# Altium footprint library Relays.PcbLib: 115 footprints (part 6 of 8)
Each footprint in its own frame and in the unit in brackets; x right, y up, seen from the top. Pads: shape width x height; smd on the part's side, far side on the other; paste and mask are expansions set on the pad; w line width, h text height; cw(c..) or ccw(c..) is an arc to the next point about the centre after c.
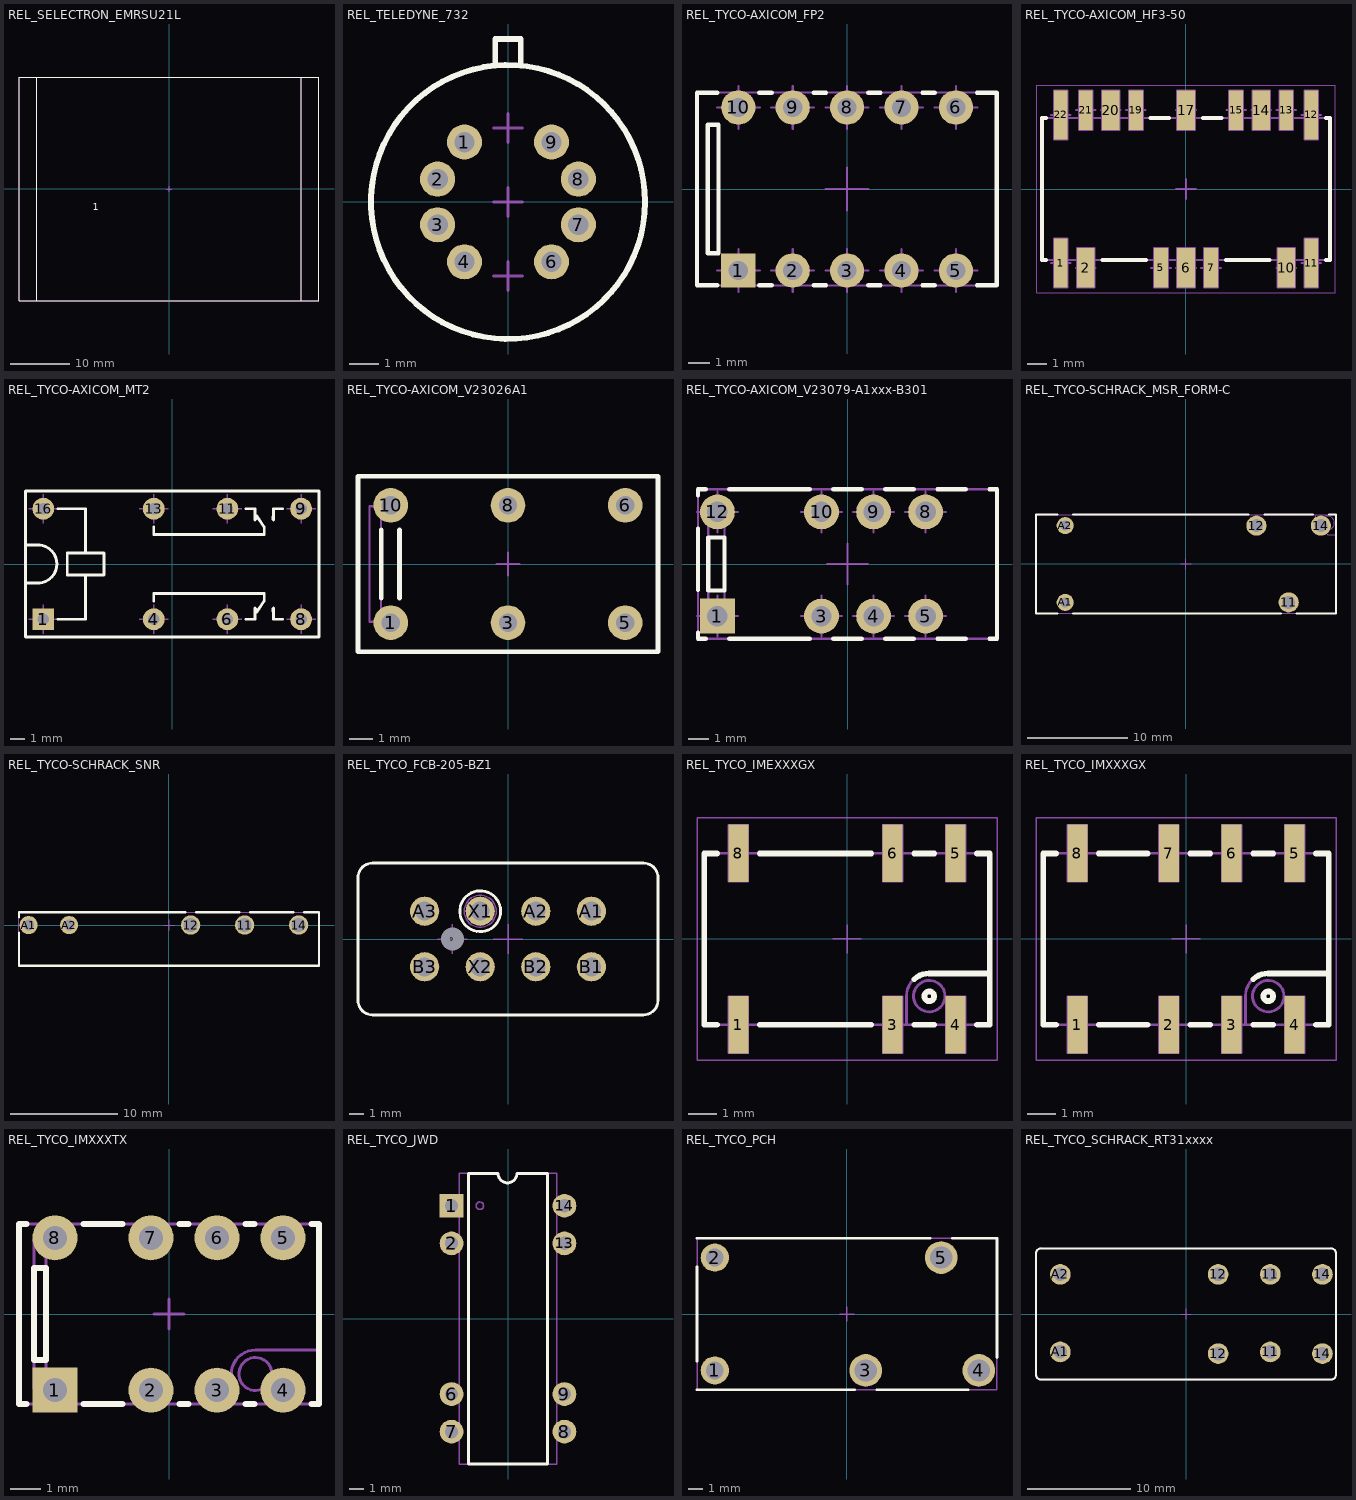
[diagram p5: the footprints below, top view; thin cyan lines are the x and y axes]

## REL_SELECTRON_EMRSU21L [mm] "Round Pluggable 11 Contacts, Body 51mm x 38mm, SELECTRON EMR Series"
height 80
Top Overlay:
  lines w0.2: -22.5,-19 -22.5,19 ; 22.5,-19 22.5,19 ; -25.5,-19 -25.5,19 25.5,19 25.5,-19 -25.5,-19
  text "1" at -12.985,-3.645 h1.2
Mechanical 8:
  lines w0.1: -0.5,0 0,0 ; 0,-0.5 0,0 ; 0,0.5 0,0 ; 0.5,0 0,0
Mechanical 14:
  lines w0.1: -22.5,-19 -22.5,19 ; 22.5,-19 22.5,19 ; -25.5,-19 -25.5,19 25.5,19 25.5,-19 -25.5,-19
  text "1" at -12.985,-3.645 h1.2
3D body "REL_SELECTRON_EMRSU21L.stp": height 67, standoff -13, extent -25.5,-19 25.5,19

## REL_TELEDYNE_732 [mm] "TELEDYNE Case TO-5, 8 Leads, Body Diameter 9.4m, x Height 9.76mm, 732 Series"
height 9.76
pads (8):
  round 1.2 hole 0.7: 1(-1.493,2.055) 2(-2.416,0.785) 3(-2.416,-0.785) 4(-1.493,-2.055) 6(1.493,-2.055) 7(2.416,-0.785) 8(2.416,0.785) 9(1.493,2.055)
Top Overlay:
  circle w0.2: c0,0 r4.7
  lines w0.2: -0.435,4.68 -0.435,5.59 0.435,5.59 0.435,4.68
Mechanical 8:
  lines w0.1: -2.891,-0.939 -2.416,-0.785 ; -2.891,0.939 -2.416,0.785 ; -2.57,-0.309 -2.416,-0.785 ; -2.57,0.309 -2.416,0.785 ; -2.261,-1.26 -2.416,-0.785 ; -2.261,1.26 -2.416,0.785 ; -1.94,-0.63 -2.416,-0.785 ; -1.94,0.63 -2.416,0.785 ; -1.897,-1.761 -1.493,-2.055 ; -1.897,1.761 -1.493,2.055 ; -1.787,-2.459 -1.493,-2.055 ; -1.787,2.459 -1.493,2.055 ; -1.199,-1.65 -1.493,-2.055 ; -1.199,1.65 -1.493,2.055 ; -1.088,-2.349 -1.493,-2.055 ; -1.088,2.349 -1.493,2.055 ; -0.5,0 0,0 ; -0.5,2.54 0,2.54 ; 0,-0.5 0,0 ; 0,0.5 0,0 ; 0,2.04 0,2.54 ; 0,3.04 0,2.54 ; 0.5,0 0,0 ; 0.5,2.54 0,2.54 ; 1.088,-2.349 1.493,-2.055 ; 1.088,2.349 1.493,2.055 ; 1.199,-1.65 1.493,-2.055 ; 1.199,1.65 1.493,2.055 ; 1.787,-2.459 1.493,-2.055 ; 1.787,2.459 1.493,2.055 ; 1.897,-1.761 1.493,-2.055 ; 1.897,1.761 1.493,2.055 ; 1.94,-0.63 2.416,-0.785 ; 1.94,0.63 2.416,0.785 ; 2.261,-1.26 2.416,-0.785 ; 2.261,1.26 2.416,0.785 ; 2.57,-0.309 2.416,-0.785 ; 2.57,0.309 2.416,0.785 ; 2.891,-0.939 2.416,-0.785 ; 2.891,0.939 2.416,0.785 ; 0,-2.54 -0.5,-2.54 0,-2.54 ; 0,-2.54 0,-2.04 0,-2.54 ; 0,-2.54 0.5,-2.54 0,-2.54 ; 0,-2.54 0,-3.04 0,-2.54
Mechanical 14:
  circle w0.1: c0,0 r4.7
  lines w0.1: -0.435,4.68 -0.435,5.59 0.435,5.59 0.435,4.68
3D body "REL_TELEDYNE_732.stp": height 9.76, standoff -3.8, extent -4.7,-4.693 4.7,5.59

## REL_TYCO-AXICOM_FP2 [mm] "Relay, 10 Leads, Row Spacing 7.62 mm; Body 14mm x 9mm, AXICOM FP2 Series"
height 5.1
pads (10):
  rect 1.6x1.6 hole 0.9: 1(-5.08,-3.81)
  round 1.6 hole 0.9: 2(-2.54,-3.81) 3(0,-3.81) 4(2.54,-3.81) 5(5.08,-3.81) 6(5.08,3.81) 7(2.54,3.81) 8(0,3.81) 9(-2.54,3.81) 10(-5.08,3.81)
Top Overlay:
  lines w0.2: -6.062,-4.5 -7.01,-4.5 -7.01,4.5 -6.062,4.5 ; -4.098,-4.5 -3.522,-4.5 ; -4.098,4.5 -3.522,4.5 ; -1.558,-4.5 -0.982,-4.5 ; -1.558,4.5 -0.982,4.5 ; 0.982,-4.5 1.558,-4.5 ; 0.982,4.5 1.558,4.5 ; 3.522,-4.5 4.098,-4.5 ; 3.522,4.5 4.098,4.5 ; 6.062,-4.5 6.99,-4.5 6.99,4.5 6.062,4.5 ; -6.51,-3 -6.01,-3 -6.01,3 -6.51,3 -6.51,-3
Mechanical 8:
  lines w0.1: -6.08,-3.81 -5.08,-3.81 ; -6.08,3.81 -5.08,3.81 ; -5.08,-4.81 -5.08,-3.81 ; -5.08,-2.81 -5.08,-3.81 ; -5.08,2.81 -5.08,3.81 ; -5.08,4.81 -5.08,3.81 ; -4.08,-3.81 -5.08,-3.81 ; -4.08,3.81 -5.08,3.81 ; -3.54,-3.81 -2.54,-3.81 ; -3.54,3.81 -2.54,3.81 ; -2.54,-4.81 -2.54,-3.81 ; -2.54,-2.81 -2.54,-3.81 ; -2.54,2.81 -2.54,3.81 ; -2.54,4.81 -2.54,3.81 ; -1.54,-3.81 -2.54,-3.81 ; -1.54,3.81 -2.54,3.81 ; -1,-3.81 0,-3.81 ; -1,0 0,0 ; -1,3.81 0,3.81 ; 0,-4.81 0,-3.81 ; 0,-2.81 0,-3.81 ; 0,-1 0,0 ; 0,1 0,0 ; 0,2.81 0,3.81 ; 0,4.81 0,3.81 ; 1,-3.81 0,-3.81 ; 1,0 0,0 ; 1,3.81 0,3.81 ; 1.54,-3.81 2.54,-3.81 ; 1.54,3.81 2.54,3.81 ; 2.54,-4.81 2.54,-3.81 ; 2.54,-2.81 2.54,-3.81 ; 2.54,2.81 2.54,3.81 ; 2.54,4.81 2.54,3.81 ; 3.54,-3.81 2.54,-3.81 ; 3.54,3.81 2.54,3.81 ; 4.08,-3.81 5.08,-3.81 ; 4.08,3.81 5.08,3.81 ; 5.08,-4.81 5.08,-3.81 ; 5.08,-2.81 5.08,-3.81 ; 5.08,2.81 5.08,3.81 ; 5.08,4.81 5.08,3.81 ; 6.08,-3.81 5.08,-3.81 ; 6.08,3.81 5.08,3.81
Mechanical 14:
  lines w0.1: -7,-4.5 7,-4.5 7,4.5 -7,4.5 -7,-4.5 ; -6.51,-3 -6.01,-3 -6.01,3 -6.51,3 -6.51,-3
3D body "REL_TYCO-AXICOM_FP2.stp": height 5.2, standoff -3.5, extent -7.01,-4.5 6.99,4.5

## REL_TYCO-AXICOM_HF3-50 [mm] "SMT Relay, HF3 Series, 50 Ohm Version, Body 14.6mm x 7.2mm"
height 10.5
pads (16):
  rect 0.7x2.5 smd: 1(-6.35,-3.75) 11(6.35,-3.75) 12(6.35,3.75) 22(-6.35,3.75)
  rect 0.9x2 smd: 2(-5.08,-4) 6(0,-4) 10(5.08,-4) 14(3.81,4) 17(0,4) 20(-3.81,4)
  rect 0.7x2 smd: 5(-1.27,-4) 7(1.27,-4) 13(5.08,4) 15(2.54,4) 19(-2.54,4) 21(-5.08,4)
Top Overlay:
  lines w0.2: -7.1,-3.6 -7.3,-3.6 -7.3,3.6 -7.1,3.6 ; -4.23,-3.6 -2.02,-3.6 ; -1.79,3.6 -0.85,3.6 ; 0.85,3.6 1.79,3.6 ; 2.02,-3.6 4.23,-3.6 ; 7.1,-3.6 7.3,-3.6 7.3,3.6 7.1,3.6
Mechanical 8:
  lines w0.1: -6.85,-3.75 -6.35,-3.75 ; -6.85,3.75 -6.35,3.75 ; -6.35,-4.25 -6.35,-3.75 ; -6.35,-3.25 -6.35,-3.75 ; -6.35,3.25 -6.35,3.75 ; -6.35,4.25 -6.35,3.75 ; -5.85,-3.75 -6.35,-3.75 ; -5.85,3.75 -6.35,3.75 ; -5.58,-4 -5.08,-4 ; -5.58,4 -5.08,4 ; -5.08,-4.5 -5.08,-4 ; -5.08,-3.5 -5.08,-4 ; -5.08,3.5 -5.08,4 ; -5.08,4.5 -5.08,4 ; -4.58,-4 -5.08,-4 ; -4.58,4 -5.08,4 ; -4.31,4 -3.81,4 ; -3.81,3.5 -3.81,4 ; -3.81,4.5 -3.81,4 ; -3.31,4 -3.81,4 ; -3.04,4 -2.54,4 ; -2.54,3.5 -2.54,4 ; -2.54,4.5 -2.54,4 ; -2.04,4 -2.54,4 ; -1.77,-4 -1.27,-4 ; -1.27,-4.5 -1.27,-4 ; -1.27,-3.5 -1.27,-4 ; -0.77,-4 -1.27,-4 ; -0.5,-4 0,-4 ; -0.5,0 0,0 ; -0.5,4 0,4 ; 0,-4.5 0,-4 ; 0,-3.5 0,-4 ; 0,-0.5 0,0 ; 0,0.5 0,0 ; 0,3.5 0,4 ; 0,4.5 0,4 ; 0.5,-4 0,-4 ; 0.5,0 0,0 ; 0.5,4 0,4 ; 0.77,-4 1.27,-4 ; 1.27,-4.5 1.27,-4 ; 1.27,-3.5 1.27,-4 ; 1.77,-4 1.27,-4 ; 2.04,4 2.54,4 ; 2.54,3.5 2.54,4 ; 2.54,4.5 2.54,4 ; 3.04,4 2.54,4 ; 3.31,4 3.81,4 ; 3.81,3.5 3.81,4 ; 3.81,4.5 3.81,4 ; 4.31,4 3.81,4 ; 4.58,-4 5.08,-4 ; 4.58,4 5.08,4 ; 5.08,-4.5 5.08,-4 ; 5.08,-3.5 5.08,-4 ; 5.08,3.5 5.08,4 ; 5.08,4.5 5.08,4 ; 5.58,-4 5.08,-4 ; 5.58,4 5.08,4 ; 5.85,-3.75 6.35,-3.75 ; 5.85,3.75 6.35,3.75 ; 6.35,-4.25 6.35,-3.75 ; 6.35,-3.25 6.35,-3.75 ; 6.35,3.25 6.35,3.75 ; 6.35,4.25 6.35,3.75 ; 6.85,-3.75 6.35,-3.75 ; 6.85,3.75 6.35,3.75 ; -6.7,-5 -6.7,-2.5 -6,-2.5 -6,-5 -6.7,-5 ; -6.7,2.5 -6.7,5 -6,5 -6,2.5 -6.7,2.5 ; -5.53,-5 -5.53,-3 -4.63,-3 -4.63,-5 -5.53,-5 ; -5.43,3 -4.73,3 -4.73,5 -5.43,5 -5.43,3 ; -4.26,3 -3.36,3 -3.36,5 -4.26,5 -4.26,3 ; -2.89,3 -2.19,3 -2.19,5 -2.89,5 -2.89,3 ; -1.62,-5 -0.92,-5 -0.92,-3 -1.62,-3 -1.62,-5 ; -0.45,-5 0.45,-5 0.45,-3 -0.45,-3 -0.45,-5 ; -0.45,3 0.45,3 0.45,5 -0.45,5 -0.45,3 ; 0.92,-5 1.62,-5 1.62,-3 0.92,-3 0.92,-5 ; 2.19,3 2.89,3 2.89,5 2.19,5 2.19,3 ; 3.36,3 4.26,3 4.26,5 3.36,5 3.36,3 ; 4.63,-5 5.53,-5 5.53,-3 4.63,-3 4.63,-5 ; 4.73,3 5.43,3 5.43,5 4.73,5 4.73,3 ; 6,-5 6,-2.5 6.7,-2.5 6.7,-5 6,-5 ; 6,2.5 6,5 6.7,5 6.7,2.5 6,2.5
Mechanical 14:
  lines w0.1: -7.3,-3.6 -7.3,3.6 7.3,3.6 7.3,-3.6 -7.3,-3.6
Mechanical 15:
  lines w0.05: -7.55,-5.25 7.55,-5.25 7.55,5.25 -7.55,5.25 -7.55,-5.25
3D body "REL_TYCO-AXICOM_HF3-50.stp": height 10, standoff 0, extent -7.3,-4.7 7.3,4.7

## REL_TYCO-AXICOM_MT2 [mm] "8 Leads, Row Spacing 7.62 mm; Body 20.25mm x 10.05mm, AXICOM MT2 Series"
height 11.2
pads (8):
  rect 1.5x1.5 hole 0.8: 1(-8.89,-3.81)
  round 1.5 hole 0.8: 4(-1.27,-3.81) 6(3.81,-3.81) 8(8.89,-3.81) 9(8.89,3.81) 11(3.81,3.81) 13(-1.27,3.81) 16(-8.89,3.81)
Top Overlay:
  lines w0.2: -10.125,-1.3 -9.125,-1.3 ccw(c-9.257,0) -9.125,1.3 -10.125,1.3 ; -7.874,-3.81 -5.969,-3.81 -5.969,-0.762 ; -7.874,3.81 -5.969,3.81 -5.969,0.762 ; -1.27,-2.54 -1.27,-2.032 6.35,-2.032 6.35,-2.54 5.842,-3.302 ; -1.27,2.54 -1.27,2.032 6.35,2.032 6.35,2.54 5.842,3.302 ; 5.08,-3.81 5.715,-3.81 5.715,-3.048 cw(c5.588,-3.175) 5.715,-3.302 ; 5.08,3.81 5.715,3.81 5.715,3.048 ccw(c5.588,3.175) 5.715,3.302 ; 6.985,-3.302 cw(c7.112,-3.175) 6.985,-3.048 6.985,-3.81 7.62,-3.81 ; 6.985,3.302 ccw(c7.112,3.175) 6.985,3.048 6.985,3.81 7.62,3.81 ; -10.125,-5.025 10.125,-5.025 10.125,5.025 -10.125,5.025 -10.125,-5.025 ; -7.239,-0.762 -7.239,0.762 -4.699,0.762 -4.699,-0.762 -7.239,-0.762
Mechanical 8:
  lines w0.1: -9.89,-3.81 -8.89,-3.81 ; -9.89,3.81 -8.89,3.81 ; -9.14,3.96 -8.64,3.66 ; -8.89,-4.81 -8.89,-3.81 ; -8.89,-2.81 -8.89,-3.81 ; -8.89,2.81 -8.89,3.81 ; -8.89,4.81 -8.89,3.81 ; -7.89,-3.81 -8.89,-3.81 ; -7.89,3.81 -8.89,3.81 ; -2.27,-3.81 -1.27,-3.81 ; -2.27,3.81 -1.27,3.81 ; -1.27,-4.81 -1.27,-3.81 ; -1.27,-2.81 -1.27,-3.81 ; -1.27,2.81 -1.27,3.81 ; -1.27,4.81 -1.27,3.81 ; -0.27,-3.81 -1.27,-3.81 ; -0.27,3.81 -1.27,3.81 ; 2.81,-3.81 3.81,-3.81 ; 2.81,3.81 3.81,3.81 ; 3.81,-4.81 3.81,-3.81 ; 3.81,-2.81 3.81,-3.81 ; 3.81,2.81 3.81,3.81 ; 3.81,4.81 3.81,3.81 ; 4.81,-3.81 3.81,-3.81 ; 4.81,3.81 3.81,3.81 ; 7.89,-3.81 8.89,-3.81 ; 7.89,3.81 8.89,3.81 ; 8.89,-4.81 8.89,-3.81 ; 8.89,-2.81 8.89,-3.81 ; 8.89,2.81 8.89,3.81 ; 8.89,4.81 8.89,3.81 ; 9.89,-3.81 8.89,-3.81 ; 9.89,3.81 8.89,3.81
Mechanical 14:
  lines w0.1: -10.125,-1.3 -9.125,-1.3 ccw(c-9.257,0) -9.125,1.3 -10.125,1.3 ; -7.874,-3.81 -5.969,-3.81 -5.969,-0.762 ; -7.874,3.81 -5.969,3.81 -5.969,0.762 ; -1.27,-2.54 -1.27,-2.032 6.35,-2.032 6.35,-2.54 5.842,-3.302 ; -1.27,2.54 -1.27,2.032 6.35,2.032 6.35,2.54 5.842,3.302 ; 5.08,-3.81 5.715,-3.81 5.715,-3.048 cw(c5.588,-3.175) 5.715,-3.302 ; 5.08,3.81 5.715,3.81 5.715,3.048 ccw(c5.588,3.175) 5.715,3.302 ; 6.985,-3.302 cw(c7.112,-3.175) 6.985,-3.048 6.985,-3.81 7.62,-3.81 ; 6.985,3.302 ccw(c7.112,3.175) 6.985,3.048 6.985,3.81 7.62,3.81 ; -10.125,-5.025 10.125,-5.025 10.125,5.025 -10.125,5.025 -10.125,-5.025 ; -7.239,-0.762 -7.239,0.762 -4.699,0.762 -4.699,-0.762 -7.239,-0.762
3D body "REL_TYCO-AXICOM_MT2.stp": height 11.7, standoff -3.5, extent -10.125,-5.025 10.125,5.025

## REL_TYCO-AXICOM_V23026A1 [mm] "Relay, 6 Leads, Row Spacing 5.08 mm; Body 13mm x 7.6mm, AXICOM V23026 Series"
height 6.9
pads (6):
  round 1.5 hole 0.8: 1(-5.08,-2.54) 3(0,-2.54) 5(5.08,-2.54) 6(5.08,2.54) 8(0,2.54) 10(-5.08,2.54)
Top Overlay:
  lines w0.2: -5.5,-1.49 -5.5,1.49 ; -4.7,-1.49 -4.7,1.49 ; -6.5,-3.8 -6.5,3.8 6.5,3.8 6.5,-3.8 -6.5,-3.8
Mechanical 8:
  lines w0.1: -5.58,-2.54 -5.08,-2.54 ; -5.58,2.54 -5.08,2.54 ; -5.08,-3.04 -5.08,-2.54 ; -5.08,-2.04 -5.08,-2.54 ; -5.08,2.04 -5.08,2.54 ; -5.08,3.04 -5.08,2.54 ; -4.58,-2.54 -5.08,-2.54 ; -4.58,2.54 -5.08,2.54 ; -0.5,-2.54 0,-2.54 ; -0.5,0 0,0 ; -0.5,2.54 0,2.54 ; 0,-3.04 0,-2.54 ; 0,-2.04 0,-2.54 ; 0,-0.5 0,0 ; 0,0.5 0,0 ; 0,2.04 0,2.54 ; 0,3.04 0,2.54 ; 0.5,-2.54 0,-2.54 ; 0.5,0 0,0 ; 0.5,2.54 0,2.54 ; 4.58,-2.54 5.08,-2.54 ; 4.58,2.54 5.08,2.54 ; 5.08,-3.04 5.08,-2.54 ; 5.08,-2.04 5.08,-2.54 ; 5.08,2.04 5.08,2.54 ; 5.08,3.04 5.08,2.54 ; 5.58,-2.54 5.08,-2.54 ; 5.58,2.54 5.08,2.54
Mechanical 14:
  lines w0.1: -6.5,-3.8 -6.5,3.8 6.5,3.8 6.5,-3.8 -6.5,-3.8 ; -6,-2.5 -5.5,-2.5 -5.5,2.5 -6,2.5 -6,-2.5
3D body "REL_TYCO-AXICOM_V23026A1.stp": height 6.9, standoff -3.5, extent -6.5,-3.8 6.5,3.8

## REL_TYCO-AXICOM_V23079-A1xxx-B301 [mm] "Relay, 8 Leads, Row Spacing 5.08 mm; Body 14.5mm x 7.2mm, AXICOM P2 Series"
height 9.9
pads (8):
  rect 1.7x1.7 hole 1: 1(-6.35,-2.54)
  round 1.7 hole 1: 3(-1.27,-2.54) 4(1.27,-2.54) 5(3.81,-2.54) 8(3.81,2.54) 9(1.27,2.54) 10(-1.27,2.54) 12(-6.35,2.54)
Top Overlay:
  lines w0.2: -7.3,-3.352 -7.3,-3.65 -6.925,-3.65 ; -7.3,-1.275 -7.3,1.728 ; -7.3,3.352 -7.3,3.65 -6.925,3.65 ; -5.775,-3.65 -1.845,-3.65 ; -5.775,3.65 -1.845,3.65 ; -0.695,-3.65 0.695,-3.65 ; -0.695,3.65 0.695,3.65 ; 1.845,-3.65 3.235,-3.65 ; 1.845,3.65 3.235,3.65 ; 4.385,-3.65 5.775,-3.65 ; 4.385,3.65 5.775,3.65 ; 6.925,-3.65 7.3,-3.65 7.3,3.65 6.925,3.65 ; -6.8,-1.29 -6,-1.29 -6,1.29 -6.8,1.29 -6.8,-1.29
Mechanical 8:
  lines w0.1: -7.35,-2.54 -6.35,-2.54 ; -7.35,2.54 -6.35,2.54 ; -6.35,-3.54 -6.35,-2.54 ; -6.35,-1.54 -6.35,-2.54 ; -6.35,1.54 -6.35,2.54 ; -6.35,3.54 -6.35,2.54 ; -5.35,-2.54 -6.35,-2.54 ; -5.35,2.54 -6.35,2.54 ; -2.27,-2.54 -1.27,-2.54 ; -2.27,2.54 -1.27,2.54 ; -1.27,-3.54 -1.27,-2.54 ; -1.27,-1.54 -1.27,-2.54 ; -1.27,1.54 -1.27,2.54 ; -1.27,3.54 -1.27,2.54 ; -1,0 0,0 ; -0.27,-2.54 -1.27,-2.54 ; -0.27,2.54 -1.27,2.54 ; 0,-1 0,0 ; 0,1 0,0 ; 0.27,-2.54 1.27,-2.54 ; 0.27,2.54 1.27,2.54 ; 1,0 0,0 ; 1.27,-3.54 1.27,-2.54 ; 1.27,-1.54 1.27,-2.54 ; 1.27,1.54 1.27,2.54 ; 1.27,3.54 1.27,2.54 ; 2.27,-2.54 1.27,-2.54 ; 2.27,2.54 1.27,2.54 ; 2.81,-2.54 3.81,-2.54 ; 2.81,2.54 3.81,2.54 ; 3.81,-3.54 3.81,-2.54 ; 3.81,-1.54 3.81,-2.54 ; 3.81,1.54 3.81,2.54 ; 3.81,3.54 3.81,2.54 ; 4.81,-2.54 3.81,-2.54 ; 4.81,2.54 3.81,2.54
Mechanical 14:
  lines w0.1: -7.3,-3.65 7.3,-3.65 7.3,3.65 -7.3,3.65 -7.3,-3.65 ; -6.8,-2.5 -6.8,2.5 -6,2.5 -6,-2.5 -6.8,-2.5
3D body "REL_TYCO-AXICOM_V23079-A1xxx-B301.stp": height 9.9, standoff -3.8, extent -7.3,-3.65 7.3,3.65

## REL_TYCO-SCHRACK_MSR_FORM-C [mm] "Relay 5 Leds, Body 30 x 10mm, Miniature Power PCB Relay, MSR V23061 Series"
height 15
pads (5):
  round 2 hole 1.3: 11(10.2,-3.81) 12(7,3.81) 14(13.4,3.81)
  round 1.7 hole 1: A1(-12,-3.81) A2(-12,3.81)
Top Overlay:
  lines w0.2: -12.783,-4.91 -14.9,-4.91 -14.9,4.91 -12.783,4.91 ; -11.217,-4.91 9.417,-4.91 ; -11.217,4.91 6.217,4.91 ; 7.783,4.91 12.617,4.91 ; 10.983,-4.91 14.9,-4.91 14.9,2.91 14.9,4.91 14.183,4.91
Mechanical 8:
  lines w0.05: -12.5,-3.81 -12,-3.81 ; -12.5,3.81 -12,3.81 ; -12,-4.31 -12,-3.81 ; -12,-3.31 -12,-3.81 ; -12,3.31 -12,3.81 ; -12,4.31 -12,3.81 ; -11.5,-3.81 -12,-3.81 ; -11.5,3.81 -12,3.81 ; -0.5,0 0,0 ; 0,-0.5 0,0 ; 0,0.5 0,0 ; 0.5,0 0,0 ; 6.5,3.81 7,3.81 ; 7,3.31 7,3.81 ; 7,4.31 7,3.81 ; 7.5,3.81 7,3.81 ; 9.7,-3.81 10.2,-3.81 ; 10.2,-4.31 10.2,-3.81 ; 10.2,-3.31 10.2,-3.81 ; 10.7,-3.81 10.2,-3.81 ; 12.9,3.81 13.4,3.81 ; 13.4,3.31 13.4,3.81 ; 13.4,4.31 13.4,3.81 ; 13.9,3.81 13.4,3.81
Mechanical 14:
  circle w0.1: c14.075,4.085 r0.675
  lines w0.1: 12.9,4.91 12.9,4.11 14.1,2.91 14.9,2.91 ; 12.9,4.91 14.9,4.91 14.9,2.91 ; 12.9,4.91 -14.9,4.91 -14.9,-4.91 14.9,-4.91 14.9,2.91
3D body "REL_TYCO-SCHRACK_MSR_FORM-C.stp": height 14.9, standoff -3.8, extent -14.9,-4.91 14.9,4.91

## REL_TYCO-SCHRACK_SNR [mm] "5 Leads, Body 28.0 x 5mm, Slim PCB Relay SNR Series"
height 15
pads (5):
  round 1.8 hole 1.3: 11(7.06,0) 12(2.02,0) 14(12.1,0)
  round 1.7 hole 1: A1(-13.1,0) A2(-9.32,0)
Top Overlay:
  lines w0.2: -14,-0.716 -14,-3.8 14,-3.8 14,1.2 12.6,1.2 ; -14,0.716 -14,1.2 1.52,1.2 ; 2.52,1.2 6.56,1.2 ; 7.56,1.2 11.6,1.2
Mechanical 8:
  lines w0.1: -13.6,0 -13.1,0 ; -13.1,-0.5 -13.1,0 ; -13.1,0.5 -13.1,0 ; -12.6,0 -13.1,0 ; -9.82,0 -9.32,0 ; -9.32,-0.5 -9.32,0 ; -9.32,0.5 -9.32,0 ; -8.82,0 -9.32,0 ; -0.5,0 0,0 ; 0,-0.5 0,0 ; 0,0.5 0,0 ; 0.5,0 0,0 ; 1.52,0 2.02,0 ; 2.02,-0.5 2.02,0 ; 2.02,0.5 2.02,0 ; 2.52,0 2.02,0 ; 6.56,0 7.06,0 ; 7.06,-0.5 7.06,0 ; 7.06,0.5 7.06,0 ; 7.56,0 7.06,0 ; 11.6,0 12.1,0 ; 12.1,-0.5 12.1,0 ; 12.1,0.5 12.1,0 ; 12.6,0 12.1,0
Mechanical 14:
  lines w0.1: -14,-3.8 14,-3.8 14,1.2 -14,1.2 -14,-3.8
3D body "REL_TYCO-CHRACK_SNR.stp": height 15, standoff -3.5, extent -14,-3.8 14,1.2

## REL_TYCO_FCB-205-BZ1 [mm] "Relay, 8 Leads, Row Spacing 3.81 mm; Body 20.57mm x 10.41mm, AXICOM FCB-205-BZ1"
height 16.26
pads (9):
  round 0.5 hole 1.6 unplated mask+0.55: 9(-3.81,0)
  round 2 hole 1.3: A1(5.715,1.905) A2(1.905,1.905) A3(-5.715,1.905) B1(5.715,-1.905) B2(1.905,-1.905) B3(-5.715,-1.905) X1(-1.905,1.905) X2(-1.905,-1.905)
Top Overlay:
  circle w0.2: c-1.905,1.905 r1.4
  lines w0.2: -10.285,-4.205 ccw(c-9.285,-4.205) -9.285,-5.205 9.285,-5.205 ccw(c9.285,-4.205) 10.285,-4.205 10.285,4.205 ccw(c9.285,4.205) 9.285,5.205 -9.285,5.205 ccw(c-9.285,4.205) -10.285,4.205 -10.285,-4.205
Mechanical 8:
  lines w0.1: -6.715,-1.905 -5.715,-1.905 ; -6.715,1.905 -5.715,1.905 ; -5.715,-2.905 -5.715,-1.905 ; -5.715,-0.905 -5.715,-1.905 ; -5.715,0.905 -5.715,1.905 ; -5.715,2.905 -5.715,1.905 ; -4.81,0 -3.81,0 ; -4.715,-1.905 -5.715,-1.905 ; -4.715,1.905 -5.715,1.905 ; -3.81,-1 -3.81,0 ; -3.81,1 -3.81,0 ; -2.905,-1.905 -1.905,-1.905 ; -2.905,1.905 -1.905,1.905 ; -2.81,0 -3.81,0 ; -1.905,-2.905 -1.905,-1.905 ; -1.905,-0.905 -1.905,-1.905 ; -1.905,0.905 -1.905,1.905 ; -1.905,2.905 -1.905,1.905 ; -1,0 0,0 ; -0.905,-1.905 -1.905,-1.905 ; -0.905,1.905 -1.905,1.905 ; 0,-1 0,0 ; 0,1 0,0 ; 0.905,-1.905 1.905,-1.905 ; 0.905,1.905 1.905,1.905 ; 1,0 0,0 ; 1.905,-2.905 1.905,-1.905 ; 1.905,-0.905 1.905,-1.905 ; 1.905,0.905 1.905,1.905 ; 1.905,2.905 1.905,1.905 ; 2.905,-1.905 1.905,-1.905 ; 2.905,1.905 1.905,1.905 ; 4.715,-1.905 5.715,-1.905 ; 4.715,1.905 5.715,1.905 ; 5.715,-2.905 5.715,-1.905 ; 5.715,-0.905 5.715,-1.905 ; 5.715,0.905 5.715,1.905 ; 5.715,2.905 5.715,1.905 ; 6.715,-1.905 5.715,-1.905 ; 6.715,1.905 5.715,1.905
Mechanical 14:
  circle w0.1: c-5.715,-1.905 r0.52
  circle w0.1: c-1.905,-1.905 r0.52
  circle w0.1: c1.905,-1.905 r0.52
  circle w0.1: c5.715,-1.905 r0.52
  circle w0.1: c5.715,1.905 r0.52
  circle w0.1: c1.905,1.905 r0.52
  circle w0.1: c-5.715,1.905 r0.52
  circle w0.1: c-3.81,0 r0.66
  circle w0.1: c-1.905,1.905 r0.52
  circle w0.1: c-1.905,1.905 r1.1
  lines w0.1: -10.285,-4.205 ccw(c-9.285,-4.205) -9.285,-5.205 9.285,-5.205 ccw(c9.285,-4.205) 10.285,-4.205 10.285,4.205 ccw(c9.285,4.205) 9.285,5.205 -9.285,5.205 ccw(c-9.285,4.205) -10.285,4.205 -10.285,-4.205
3D body "REL_TYCO_FCB-205-BZ1.stp": height 16.26, standoff -3.4, extent -10.285,-5.205 10.285,5.205

## REL_TYCO_IMEXXXGX [mm] "6 Gull Wings Leads SMT Relay, IME Series, Body 10mm x 6mm"
height 5.65
pads (6):
  rect 0.7x2 smd: 1(-3.8,-3) 3(1.6,-3) 4(3.8,-3) 5(3.8,3) 6(1.6,3) 8(-3.8,3)
Top Overlay:
  circle w0.2: c2.88,-2.004 r0.17
  lines w0.2: -4.55,-3.004 -5,-3.004 -5,2.996 -4.55,2.996 ; -3.05,-3.004 0.85,-3.004 ; -3.05,2.996 0.85,2.996 ; 2.35,-3.004 3.05,-3.004 ; 2.35,-1.405 cw(c2.88,-2.004) 2.88,-1.204 4.996,-1.204 ; 2.35,2.996 3.05,2.996 ; 4.55,-3.004 5,-3.004 5,2.996 4.55,2.996
Mechanical 8:
  lines w0.05: -4.3,-3 -3.8,-3 ; -4.3,3 -3.8,3 ; -3.8,-3.5 -3.8,-3 ; -3.8,-2.5 -3.8,-3 ; -3.8,2.5 -3.8,3 ; -3.8,3.5 -3.8,3 ; -3.3,-3 -3.8,-3 ; -3.3,3 -3.8,3 ; -0.5,0 0,0 ; 0,-0.5 0,0 ; 0,0.5 0,0 ; 0.5,0 0,0 ; 1.1,-3 1.6,-3 ; 1.1,3 1.6,3 ; 1.6,-3.5 1.6,-3 ; 1.6,-2.5 1.6,-3 ; 1.6,2.5 1.6,3 ; 1.6,3.5 1.6,3 ; 2.1,-3 1.6,-3 ; 2.1,3 1.6,3 ; 3.3,-3 3.8,-3 ; 3.3,3 3.8,3 ; 3.8,-3.5 3.8,-3 ; 3.8,-2.5 3.8,-3 ; 3.8,2 3.8,4 ; 3.8,2.5 3.8,3 ; 3.8,3.5 3.8,3 ; 4.3,-3 3.8,-3 ; 4.3,3 3.8,3 ; 3.45,-4 4.15,-4 4.15,-2 3.45,-2 ; 3.45,-4 3.45,-2 ; 3.45,-4 3.45,-2 ; 3.45,2 4.15,2 4.15,4 3.45,4 ; 3.45,2 3.45,4 ; 3.45,2 3.45,4 ; -4.15,-4 -3.45,-4 -3.45,-2 -4.15,-2 -4.15,-4 ; -4.15,2 -3.45,2 -3.45,4 -4.15,4 -4.15,2 ; 1.25,-4 1.95,-4 1.95,-2 1.25,-2 1.25,-4 ; 1.25,2 1.95,2 1.95,4 1.25,4 1.25,2
Mechanical 14:
  circle w0.1: c2.88,-2 r0.55
  lines w0.1: -4,-3 -4,-3.758 -3.6,-3.758 -3.6,-3 ; -4,3 -4,3.758 -3.6,3.758 -3.6,3 ; 1.4,-3 1.4,-3.75 1.8,-3.75 1.8,-3 ; 1.4,3 1.4,3.75 1.8,3.75 1.8,3 ; 2.08,-3 2.08,-2 cw(c2.88,-2) 2.88,-1.2 5,-1.2 ; 3.6,-3 3.6,-3.75 4,-3.75 4,-3 ; 3.6,3 3.6,3.75 4,3.75 4,3 ; -5,-3 -5,3 5,3 5,-3 -5,-3
Mechanical 15:
  lines w0.05: -5.25,-4.25 5.25,-4.25 5.25,4.25 -5.25,4.25 -5.25,-4.25
3D body "REL_TYCO_IMEXXXGX.stp": height 5.65, standoff 0, extent -5,-3.758 5,3.758

## REL_TYCO_IMXXXGX [mm] "8 Gull Wings Leads SMT Relay, IM Series, Body 10mm x 6mm"
height 5.65
pads (8):
  rect 0.7x2 smd: 1(-3.8,-3) 2(-0.6,-3) 3(1.6,-3) 4(3.8,-3) 5(3.8,3) 6(1.6,3) 7(-0.6,3) 8(-3.8,3)
Top Overlay:
  circle w0.2: c2.88,-2.004 r0.17
  lines w0.2: -4.55,-3.004 -5,-3.004 -5,2.996 -4.55,2.996 ; -3.05,-3.004 -1.35,-3.004 ; -3.05,2.996 -1.35,2.996 ; 0.15,-3.004 0.85,-3.004 ; 0.15,2.996 0.85,2.996 ; 2.35,-3.004 3.05,-3.004 ; 2.35,-1.405 cw(c2.88,-2.004) 2.88,-1.204 4.996,-1.204 ; 2.35,2.996 3.05,2.996 ; 4.55,-3.004 5,-3.004 5,2.996 4.55,2.996
Mechanical 8:
  lines w0.05: -4.3,-3 -3.8,-3 ; -4.3,3 -3.8,3 ; -3.8,-3.5 -3.8,-3 ; -3.8,-2.5 -3.8,-3 ; -3.8,2.5 -3.8,3 ; -3.8,3.5 -3.8,3 ; -3.3,-3 -3.8,-3 ; -3.3,3 -3.8,3 ; -1.1,-3 -0.6,-3 ; -1.1,3 -0.6,3 ; -0.6,-3.5 -0.6,-3 ; -0.6,-2.5 -0.6,-3 ; -0.6,2.5 -0.6,3 ; -0.6,3.5 -0.6,3 ; -0.5,0 0,0 ; -0.1,-3 -0.6,-3 ; -0.1,3 -0.6,3 ; 0,-0.5 0,0 ; 0,0.5 0,0 ; 0.5,0 0,0 ; 1.1,-3 1.6,-3 ; 1.1,3 1.6,3 ; 1.6,-3.5 1.6,-3 ; 1.6,-2.5 1.6,-3 ; 1.6,2.5 1.6,3 ; 1.6,3.5 1.6,3 ; 2.1,-3 1.6,-3 ; 2.1,3 1.6,3 ; 3.3,-3 3.8,-3 ; 3.3,3 3.8,3 ; 3.8,-3.5 3.8,-3 ; 3.8,-2.5 3.8,-3 ; 3.8,2 3.8,4 ; 3.8,2.5 3.8,3 ; 3.8,3.5 3.8,3 ; 4.3,-3 3.8,-3 ; 4.3,3 3.8,3 ; 3.45,-4 4.15,-4 4.15,-2 3.45,-2 ; 3.45,-4 3.45,-2 ; 3.45,-4 3.45,-2 ; 3.45,2 4.15,2 4.15,4 3.45,4 ; 3.45,2 3.45,4 ; 3.45,2 3.45,4 ; -4.15,-4 -3.45,-4 -3.45,-2 -4.15,-2 -4.15,-4 ; -4.15,2 -3.45,2 -3.45,4 -4.15,4 -4.15,2 ; -0.95,-4 -0.25,-4 -0.25,-2 -0.95,-2 -0.95,-4 ; -0.95,2 -0.25,2 -0.25,4 -0.95,4 -0.95,2 ; 1.25,-4 1.95,-4 1.95,-2 1.25,-2 1.25,-4 ; 1.25,2 1.95,2 1.95,4 1.25,4 1.25,2
Mechanical 14:
  circle w0.1: c2.88,-2 r0.55
  lines w0.1: -4,-3 -4,-3.758 -3.6,-3.758 -3.6,-3 ; -4,3 -4,3.758 -3.6,3.758 -3.6,3 ; -0.8,-3 -0.8,-3.75 -0.4,-3.75 -0.4,-3 ; -0.8,3 -0.8,3.75 -0.4,3.75 -0.4,3 ; 1.4,-3 1.4,-3.75 1.8,-3.75 1.8,-3 ; 1.4,3 1.4,3.75 1.8,3.75 1.8,3 ; 2.08,-3 2.08,-2 cw(c2.88,-2) 2.88,-1.2 5,-1.2 ; 3.6,-3 3.6,-3.75 4,-3.75 4,-3 ; 3.6,3 3.6,3.75 4,3.75 4,3 ; -5,-3 -5,3 5,3 5,-3 -5,-3
Mechanical 15:
  lines w0.05: -5.25,-4.25 -5.25,4.25 5.25,4.25 5.25,-4.25 -5.25,-4.25
3D body "REL_TYCO_IMXXXGX.stp": height 5.65, standoff 0, extent -5,-3.758 5,3.758

## REL_TYCO_IMXXXTX [mm] "Relay, 8 Leads, Row Spacing 5.08 mm; Body 14.5mm x 7.2mm, AXICOM P2 Series"
height 9.9
pads (8):
  rect 1.5x1.5 hole 0.8: 1(-3.8,-2.54)
  round 1.5 hole 0.8: 2(-0.6,-2.54) 3(1.6,-2.54) 4(3.8,-2.54) 5(3.8,2.54) 6(1.6,2.54) 7(-0.6,2.54) 8(-3.8,2.54)
Top Overlay:
  lines w0.2: -4.744,-3 -5,-3 -5,3 -4.744,3 ; -2.856,-3 -1.544,-3 ; -2.856,3 -1.544,3 ; 0.344,-3 0.656,-3 ; 0.344,3 0.656,3 ; 2.544,-3 2.856,-3 ; 2.544,3 2.856,3 ; 4.744,-3 5,-3 5,3 4.744,3 ; -4.5,-1.534 -4.5,1.534 -4.1,1.534 -4.1,-1.534 -4.5,-1.534
Mechanical 8:
  lines w0.1: -4.3,-2.54 -3.8,-2.54 ; -4.3,2.54 -3.8,2.54 ; -3.8,-3.04 -3.8,-2.54 ; -3.8,-2.04 -3.8,-2.54 ; -3.8,2.04 -3.8,2.54 ; -3.8,3.04 -3.8,2.54 ; -3.3,-2.54 -3.8,-2.54 ; -3.3,2.54 -3.8,2.54 ; -1.1,-2.54 -0.6,-2.54 ; -1.1,2.54 -0.6,2.54 ; -0.6,-3.04 -0.6,-2.54 ; -0.6,-2.04 -0.6,-2.54 ; -0.6,2.04 -0.6,2.54 ; -0.6,3.04 -0.6,2.54 ; -0.5,0 0,0 ; -0.1,-2.54 -0.6,-2.54 ; -0.1,2.54 -0.6,2.54 ; 0,-0.5 0,0 ; 0,0.5 0,0 ; 0.5,0 0,0 ; 1.1,-2.54 1.6,-2.54 ; 1.1,2.54 1.6,2.54 ; 1.6,-3.04 1.6,-2.54 ; 1.6,-2.04 1.6,-2.54 ; 1.6,2.04 1.6,2.54 ; 1.6,3.04 1.6,2.54 ; 2.1,-2.54 1.6,-2.54 ; 2.1,2.54 1.6,2.54 ; 3.3,-2.54 3.8,-2.54 ; 3.3,2.54 3.8,2.54 ; 3.8,-3.04 3.8,-2.54 ; 3.8,-2.04 3.8,-2.54 ; 3.8,2.04 3.8,2.54 ; 3.8,3.04 3.8,2.54 ; 4.3,-2.54 3.8,-2.54 ; 4.3,2.54 3.8,2.54
Mechanical 14:
  circle w0.1: c2.88,-2 r0.55
  lines w0.1: 2.08,-3 2.08,-2 cw(c2.88,-2) 2.88,-1.2 5,-1.2 ; -5,-3 5,-3 5,3 -5,3 -5,-3 ; -4.5,-2.5 -4.5,2.5 -4.1,2.5 -4.1,-2.5 -4.5,-2.5
3D body "REL_TYCO_IMXXXTX.stp": height 5.65, standoff -2.6, extent -5,-3 5,3

## REL_TYCO_JWD [mm] "DIP 14 Leads, Row Spacing 7.62 mm; Pitch 2.54 mm"
height 8
pads (8):
  rect 1.6x1.6 hole 0.9: 1(-3.81,7.62)
  round 1.6 hole 0.9: 2(-3.81,5.08) 6(-3.81,-5.08) 7(-3.81,-7.62) 8(3.81,-7.62) 9(3.81,-5.08) 13(3.81,5.08) 14(3.81,7.62)
Top Overlay:
  lines w0.2: -0.685,9.8 -2.65,9.8 -2.65,-9.8 2.65,-9.8 2.65,9.8 ; -0.67,9.8 ccw(c-0.035,9.8) 0.6,9.8 2.615,9.8
Mechanical 14:
  circle w0.1: c-1.905,7.62 r0.254
  lines w0.1: -3.3,-9.8 3.3,-9.8 3.3,9.8 0.6,9.8 cw(c-0.035,9.8) -0.67,9.8 -3.3,9.8 -3.3,-9.8
3D body "REL_TYCO_JWD.stp": height 8, standoff -3.3, extent -3.935,-9.845 3.935,9.845

## REL_TYCO_PCH [mm] "5 Leads, Row Spacing 7.62 mm; Body 20mm x 10mm, TYCO PCH Series"
height 15.2
pads (5):
  round 1.9 hole 1.2: 1(-8.9,-3.8) 2(-8.9,3.8)
  round 2.2 hole 1.5: 3(1.26,-3.8) 4(8.88,-3.8) 5(6.34,3.8)
Top Overlay:
  lines w0.2: -10.1,-5.1 0.512,-5.1 ; -10.1,-3.182 -10.1,3.182 ; -10.1,5.1 5.592,5.1 ; 2.008,-5.1 8.132,-5.1 ; 7.088,5.1 10.1,5.1 10.1,-2.927
Mechanical 8:
  lines w0.1: -9.4,-3.8 -8.9,-3.8 ; -9.4,3.8 -8.9,3.8 ; -8.9,-4.3 -8.9,-3.8 ; -8.9,-3.3 -8.9,-3.8 ; -8.9,3.3 -8.9,3.8 ; -8.9,4.3 -8.9,3.8 ; -8.4,-3.8 -8.9,-3.8 ; -8.4,3.8 -8.9,3.8 ; -0.5,0 0,0 ; 0,-0.5 0,0 ; 0,0.5 0,0 ; 0.5,0 0,0 ; 0.76,-3.8 1.26,-3.8 ; 1.26,-4.3 1.26,-3.8 ; 1.26,-3.3 1.26,-3.8 ; 1.76,-3.8 1.26,-3.8 ; 5.84,3.8 6.34,3.8 ; 6.34,3.3 6.34,3.8 ; 6.34,4.3 6.34,3.8 ; 6.84,3.8 6.34,3.8 ; 8.38,-3.8 8.88,-3.8 ; 8.88,-4.3 8.88,-3.8 ; 8.88,-3.3 8.88,-3.8 ; 9.38,-3.8 8.88,-3.8
Mechanical 14:
  lines w0.1: -10.1,-5.1 10.1,-5.1 10.1,5.1 -10.1,5.1 -10.1,-5.1
3D body "REL_TYCO_PCH.stp": height 15.2, standoff -3.8, extent -10.1,-5.1 10.1,5.1

## REL_TYCO_SCHRACK_RT31xxxx [mm] "8 Leads, Row Spacing 7.62 mm; Body 29mm x 12.7mm, TYCO RT Series"
height 15.7
pads (8):
  round 2 hole 1.3: 11(8.15,-3.67) 11(8.15,3.83) 12(3.11,-3.83) 12(3.11,3.83) 14(13.19,-3.83) 14(13.19,3.83) A1(-12.15,-3.67) A2(-12.15,3.83)
Top Overlay:
  lines w0.2: -14.5,-5.85 ccw(c-14,-5.85) -14,-6.35 14,-6.35 ccw(c14,-5.85) 14.5,-5.85 14.5,5.85 ccw(c14,5.85) 14,6.35 -14,6.35 ccw(c-14,5.85) -14.5,5.85 -14.5,-5.85
Mechanical 8:
  lines w0.1: -12.65,-3.67 -12.15,-3.67 ; -12.65,3.83 -12.15,3.83 ; -12.15,-4.17 -12.15,-3.67 ; -12.15,-3.17 -12.15,-3.67 ; -12.15,3.33 -12.15,3.83 ; -12.15,4.33 -12.15,3.83 ; -11.65,-3.67 -12.15,-3.67 ; -11.65,3.83 -12.15,3.83 ; -0.5,0 0,0 ; 0,-0.5 0,0 ; 0,0.5 0,0 ; 0.5,0 0,0 ; 2.61,-3.83 3.11,-3.83 ; 2.61,3.83 3.11,3.83 ; 3.11,-4.33 3.11,-3.83 ; 3.11,-3.33 3.11,-3.83 ; 3.11,3.33 3.11,3.83 ; 3.11,4.33 3.11,3.83 ; 3.61,-3.83 3.11,-3.83 ; 3.61,3.83 3.11,3.83 ; 7.65,-3.67 8.15,-3.67 ; 7.65,3.83 8.15,3.83 ; 8.15,-4.17 8.15,-3.67 ; 8.15,-3.17 8.15,-3.67 ; 8.15,3.33 8.15,3.83 ; 8.15,4.33 8.15,3.83 ; 8.65,-3.67 8.15,-3.67 ; 8.65,3.83 8.15,3.83 ; 12.69,-3.83 13.19,-3.83 ; 12.69,3.83 13.19,3.83 ; 13.19,-4.33 13.19,-3.83 ; 13.19,-3.33 13.19,-3.83 ; 13.19,3.33 13.19,3.83 ; 13.19,4.33 13.19,3.83 ; 13.69,-3.83 13.19,-3.83 ; 13.69,3.83 13.19,3.83
Mechanical 14:
  lines w0.1: -14.5,-5.85 ccw(c-14,-5.85) -14,-6.35 14,-6.35 ccw(c14,-5.85) 14.5,-5.85 14.5,5.85 ccw(c14,5.85) 14,6.35 -14,6.35 ccw(c-14,5.85) -14.5,5.85 -14.5,-5.85
3D body "REL_TYCO_SCHRACK_RT314012.stp": height 15.7, standoff -3.6, extent -14.5,-6.35 14.5,6.35